# Altium schematic symbol library Schlib.SchLib: 725 symbols (part 5 of 6)
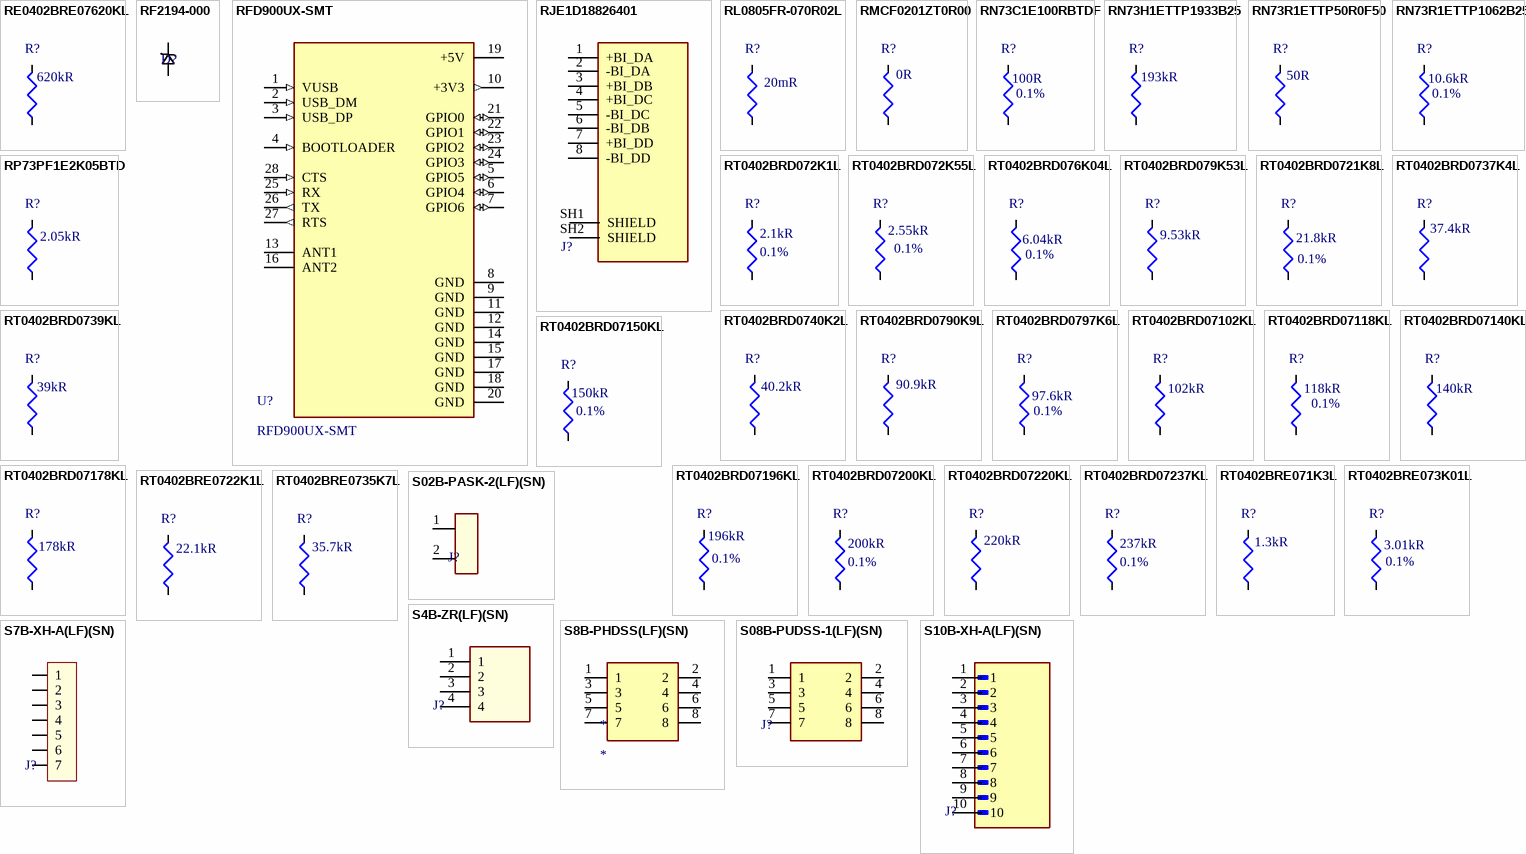
[diagram p25: symbols RE0402BRE07620KL to S10B-XH-A(LF)(SN)]

## RT0402BRD0790K9L
designator R?  value 90.9kR  (hidden comment: *)
Res Thin Film 0402 90.9K Ohm 0.1% 0.063W(1/16W) ±25ppm/C Pad SMD T/R; Manufacturer: Yageo; Manufacturer Part Number: RT0402BRD0790K9L; Voltage Rating (DC): 50V; Supplier: Digikey; Supplier Part Number: YAG1489CT-ND; RoHS: Yes; Category: Chip SMD Resistors; Stock: 8815; Pricing: 1=0.16, 10=0.121, 50=0.0958, 100=0.0859, 500=0.0654, 1000=0.0578, 5000=0.04283 (USD); Lead Free: 5697LeadFree; RoHS Compliant: 5897YesNo; ComponentLink1URL: https://datasheet.ciiva.com/2582/pyu-rt-1-to-0-05-rohs-l-4-2582525.pdf?src-supplier=Digikey; ComponentLink1Description: https://datasheet.ciiva.com/2582/pyu-rt-1-to-0-05-rohs-l-4-2582525.pdf?src-supplier=Digikey; ComponentLink2URL: https://datasheet.ciiva.com/46635/pyu-rt-1-to-0-05-rohs-l-5-46635097.pdf?src-supplier=Digikey; ComponentLink2Description: https://datasheet.ciiva.com/46635/pyu-rt-1-to-0-05-rohs-l-5-46635097.pdf?src-supplier=Digikey; Parameter 1: *; Case/Package: 0402
footprint R 0402 (1005 Metric) (Chip Capacitor, Body 1.0x0.5mm, IPC High Density)
pins: 1 B, 2 A

## RT0402BRD0797K6L
designator R?  value 97.6kR  Tolerance: 0.1%  (hidden comment: *)
Res Thin Film 0402 97.6K Ohm 0.1% 0.063W(1/16W) ±25ppm/C Pad SMD T/R; Manufacturer: Yageo; Manufacturer Part Number: RT0402BRD0797K6L; Voltage Rating (DC): 50V; Supplier: Arrow Electronics; Supplier Part Number: RT0402BRD0797K6L; RoHS: Yes; Category: Chip SMD Resistors; Stock: 301; Pricing: 1=0.0267, 10=0.0253, 25=0.024, 100=0.0227, 250=0.0214 (USD); Lead Free: 5697LeadFree; ComponentLink1URL: https://datasheet.ciiva.com/2582/pyu-rt-1-to-0-05-rohs-l-5-2582537.pdf?src-supplier=Digikey; ComponentLink1Description: https://datasheet.ciiva.com/2582/pyu-rt-1-to-0-05-rohs-l-5-2582537.pdf?src-supplier=Digikey; Parameter 1: *
footprint R 0402 (1005 Metric) (Chip Capacitor, Body 1.0x0.5mm, IPC High Density)
pins: 1 B, 2 A

## RT0402BRD07102KL
designator R?  value 102kR  (hidden comment: *)
Res Thin Film 0402 102K Ohm 0.1% 0.063W(1/16W) ±25ppm/C Pad SMD T/R; Manufacturer: Yageo; Manufacturer Part Number: RT0402BRD07102KL; Voltage Rating: 50V; Power Rating: 62.5mW; Max Power Dissipation: 63mW; Temperature Coefficient: 25ppm/°C; Supplier: Avnet; Supplier Part Number: RT0402BRD07102KL; RoHS: Yes; Category: Chip SMD Resistors; Stock: 10000; Pricing: 10000=0.02244 (USD); Case/Package: 0402; Case Code (Metric): 1005; Case Code (Imperial): 0402; Min Operating Temperature: -55°C; Max Operating Temperature: 155°C; Tolerance: 0.1%; Packaging: Tape and Reel; Number of Terminations: 2; Package Quantity: 10000; Termination: SMD/SMT; Voltage Rating (DC): 50V; Features: Moisture Resistant; Series: RT; Length: 0.039inch; Width: 0.02inch; Height: 0.014inch; Lead Free: Lead Free; RoHS Compliant: Yes; ComponentLink1URL: https://datasheet.ciiva.com/12724/pyu-rt-1-to-0-05-rohs-l-4-12724383.pdf?src-supplier=Mouser; ComponentLink1Description: https://datasheet.ciiva.com/12724/pyu-rt-1-to-0-05-rohs-l-4-12724383.pdf?src-supplier=Mouser
footprint R 0402 (1005 Metric) (Chip Capacitor, Body 1.0x0.5mm, IPC High Density)
pins: 1 B, 2 A

## RT0402BRD07118KL
designator R?  value 118kR  Tolerance: 0.1%  (hidden comment: *)
Thin Film Resistors - SMD 1/16W 118K ohm .1% 25ppm; Manufacturer: Yageo; Manufacturer Part Number: RT0402BRD07118KL; Voltage Rating: 50V; Power Rating: 62.5mW; Temperature Coefficient: 25ppm/°C; Max Power Dissipation: 63mW; Supplier: Digikey; Supplier Part Number: 13-RT0402BRD07118KLCT-ND; RoHS: Yes; Category: Chip SMD Resistors; Stock: 19401; Pricing: 1=0.2, 10=0.153, 50=0.1204, 100=0.1081, 500=0.0816, 1000=0.07242, 5000=0.05304 (USD); Case/Package: 0402; Case Code (Metric): 1005; Case Code (Imperial): 0402; Min Operating Temperature: -55°C; Max Operating Temperature: 155°C; Packaging: Tape and Reel; Termination: SMD/SMT; Number of Terminations: 2; Features: Moisture Resistant; Series: RT; Length: 0.039inch; Width: 0.02inch; Height: 0.014inch; RoHS Compliant: Yes; ComponentLink1URL: https://datasheet.ciiva.com/12722/pyu-rt-1-to-0-05-rohs-l-4-12722485.pdf?src-supplier=Mouser; ComponentLink1Description: https://datasheet.ciiva.com/12722/pyu-rt-1-to-0-05-rohs-l-4-12722485.pdf?src-supplier=Mouser
footprint R 0402 (1005 Metric) (Chip Capacitor, Body 1.0x0.5mm, IPC High Density)
pins: 1 B, 2 A

## RT0402BRD07140KL
designator R?  value 140kR  (hidden comment: *)
SMD Chip Resistor, 140 kOhm, ± 0.1%, 63 mW, 0402 [1005 Metric], Thin Film, High Precision High Stability; Manufacturer: Yageo; Manufacturer Part Number: RT0402BRD07140KL; Temperature Coefficient: 25ppm/°C; Supplier: Farnell; Supplier Part Number: 4312055; RoHS: Yes; Category: Chip SMD Resistors; Stock: 9900; Pricing: 10=0.121, 100=0.105, 500=0.066, 2500=0.057, 5000=0.048, 10000=0.047, 50000=0.0461, 100000=0.0451 (EUR); Case/Package: 0402; Packaging: 10Packaging; ComponentLink1URL: https://datasheet.octopart.com/RT0402BRD07140KL-Yageo-datasheet-166250672.pdf?src-supplier=Future+Electronics; ComponentLink1Description: https://datasheet.octopart.com/RT0402BRD07140KL-Yageo-datasheet-166250672.pdf?src-supplier=Future+Electronics; ComponentLink2URL: https://datasheet.octopart.com/RT0402BRD07140KL-Yageo-datasheet-164439670.pdf?src-supplier=Newark; ComponentLink2Description: https://datasheet.octopart.com/RT0402BRD07140KL-Yageo-datasheet-164439670.pdf?src-supplier=Newark
footprint R 0402 (1005 Metric) (Chip Capacitor, Body 1.0x0.5mm, IPC High Density)
pins: 1 B, 2 A

## RT0402BRD07150KL
designator R?  value 150kR  Tolerance: 0.1%  (hidden comment: *)
Fixed Resistor, Thin Film, 0.0625W, 150000ohm, 50V, 0.1% +/-Tol, 25ppm/Cel, Surface Mount, 0402; Manufacturer: Yageo; Manufacturer Part Number: RT0402BRD07150KL; Power Rating: 63mW; Temperature Coefficient: 25ppm/°C; Supplier: Avnet; Supplier Part Number: RT0402BRD07150KL; RoHS: Yes; Category: Chip SMD Resistors; Stock: 10000; Pricing: 10000=0.01953, 20000=0.01936, 40000=0.01903, 60000=0.0187, 80000=0.01837 (USD); Case/Package: 0402; Min Operating Temperature: -55°C; Max Operating Temperature: 155°C; Packaging: 10Packaging; Voltage Rating: 50V; Height: 350um; RoHS Compliant: Yes
footprint R 0402 (1005 Metric) (Chip Capacitor, Body 1.0x0.5mm, IPC High Density)
pins: 1 B, 2 A

## RT0402BRD07178KL
designator R?  value 178kR  (hidden comment: *)
SMD Chip Resistor, 178 kOhm, ± 0.1%, 63 mW, 0402 [1005 Metric], Thin Film, High Precision High Stability; Manufacturer: Yageo; Manufacturer Part Number: RT0402BRD07178KL; Max Power Dissipation: 63mW; Temperature Coefficient: 25ppm/°C; Voltage Rating: 50V; Supplier: Digikey; Supplier Part Number: 13-RT0402BRD07178KLCT-ND; RoHS: Yes; Category: Chip SMD Resistors; Stock: 8658; Pricing: 1=0.2, 10=0.153, 50=0.1204, 100=0.1081, 500=0.0816, 1000=0.07242, 5000=0.05304 (USD); Case/Package: 0402; Min Operating Temperature: -55°C; Max Operating Temperature: 155°C; Packaging: Tape and Reel; Number of Terminations: 2; Tolerance: 0.1%; Features: Moisture Resistant; Series: RT; Length: 0.039inch; Width: 0.02inch; Height: 0.014inch; ComponentLink1URL: http://www.yageo.com/documents/recent/PYu-RT_1-to-0.01_RoHS_L_8.pdf?src-supplier=Digikey; ComponentLink1Description: http://www.yageo.com/documents/recent/PYu-RT_1-to-0.01_RoHS_L_8.pdf?src-supplier=Digikey
footprint R 0402 (1005 Metric) (Chip Capacitor, Body 1.0x0.5mm, IPC High Density)
pins: 1 B, 2 A

## RT0402BRD07196KL
designator R?  value 196kR  Tolerance: 0.1%  (hidden comment: *)
High Precision-High Stability Chip Resistor Thin Film 0402 196kOhm 0.1% Paper T/R; Manufacturer: Yageo; Manufacturer Part Number: RT0402BRD07196KL; Supplier: Digikey; Supplier Part Number: 13-RT0402BRD07196KLCT-ND; RoHS: Yes; Category: Chip SMD Resistors; Stock: 9600; Pricing: 1=0.2, 10=0.15, 50=0.1174, 100=0.1051, 500=0.07972, 1000=0.07035, 5000=0.05199 (USD); RoHS Compliant: Yes; Case/Package: 0402
footprint R 0402 (1005 Metric) (Chip Capacitor, Body 1.0x0.5mm, IPC High Density)
pins: 1 B, 2 A

## RT0402BRD07200KL
designator R?  value 200kR  Tolerance: 0.1%  (hidden comment: *)
Fixed Resistor, Thin Film, 0.0625W, 200000ohm, 50V, 0.1% +/-Tol, 25ppm/Cel, Surface Mount, 0402; Manufacturer: Yageo; Manufacturer Part Number: RT0402BRD07200KL; Supplier: Rs; Supplier Part Number: 1991302P; RoHS: Yes; Category: Chip SMD Resistors; Stock: 15000; Pricing: 100=0.099, 250=0.082, 500=0.066, 1000=0.055 (EUR); Voltage Rating: 50V; ComponentLink1URL: https://datasheet.octopart.com/RT0402BRD07200KL-Yageo-datasheet-166250672.pdf?src-supplier=Future+Electronics; ComponentLink1Description: https://datasheet.octopart.com/RT0402BRD07200KL-Yageo-datasheet-166250672.pdf?src-supplier=Future+Electronics; ComponentLink2URL: http://www.yageo.com/documents/recent/PYu-RT_1-to-0.01_RoHS_L_9.pdf?src-supplier=Digikey; ComponentLink2Description: http://www.yageo.com/documents/recent/PYu-RT_1-to-0.01_RoHS_L_9.pdf?src-supplier=Digikey; ComponentLink3URL: https://datasheet.octopart.com/RT0402BRD07200KL-Yageo-datasheet-164439670.pdf?src-supplier=Newark; ComponentLink3Description: https://datasheet.octopart.com/RT0402BRD07200KL-Yageo-datasheet-164439670.pdf?src-supplier=Newark; Case/Package: 0402
footprint R 0402 (1005 Metric) (Chip Capacitor, Body 1.0x0.5mm, IPC High Density)
pins: 1 B, 2 A

## RT0402BRD07220KL
designator R?  value 220kR  (hidden comment: *)
High Precision-High Stability Chip Resistor Thin Film 0402 220kOhm 0.1% Paper T/R; Manufacturer: Yageo; Manufacturer Part Number: RT0402BRD07220KL; Supplier: Arrow Electronics; Supplier Part Number: RT0402BRD07220KL; RoHS: Yes; Category: Chip SMD Resistors; Stock: 310000; Pricing: 10000=0.047, 20000=0.0452, 30000=0.0442, 50000=0.0425, 100000=0.0416 (USD); Case/Package: 0402
footprint R 0402 (1005 Metric) (Chip Capacitor, Body 1.0x0.5mm, IPC High Density)
pins: 1 B, 2 A

## RT0402BRD07237KL
designator R?  value 237kR  Tolerance: 0.1%  (hidden comment: *)
Res Thin Film 0402 237K Ohm 0.1% 1/16W ±25ppm/°C Molded SMD Paper T/R; Manufacturer: Yageo; Manufacturer Part Number: RT0402BRD07237KL; Supplier: Digikey; Supplier Part Number: 13-RT0402BRD07237KLCT-ND; RoHS: Yes; Category: Chip SMD Resistors; Stock: 26932; Pricing: 1=0.13, 10=0.098, 50=0.0772, 100=0.0691, 500=0.05242, 1000=0.0466 (USD); Case/Package: 343Case; Packaging: 10Packaging; Temperature Coefficient: 25ppm/°C; RoHS Compliant: Yes
footprint R 0402 (1005 Metric) (Chip Capacitor, Body 1.0x0.5mm, IPC High Density)
pins: 1 B, 2 A

## RT0402BRE071K3L
designator R?  value 1.3kR  (hidden comment: *)
Res Thin Film 0402 1.3K Ohm 0.1% 1/16W ±50ppm/°C Molded SMD Paper T/R; Manufacturer: Yageo; Manufacturer Part Number: RT0402BRE071K3L; Supplier: Future Electronics; Supplier Part Number: 1029168; RoHS: Yes; Category: Chip SMD Resistors; Stock: 50000; Pricing: 10000=0.027, 20000=0.0266, 30000=0.0264, 40000=0.0262, 50000=0.0256 (USD); ComponentLink1URL: https://datasheet.ciiva.com/2582/pyu-rt-1-to-0-05-rohs-l-5-2582654.pdf?src-supplier=Digikey; ComponentLink1Description: https://datasheet.ciiva.com/2582/pyu-rt-1-to-0-05-rohs-l-5-2582654.pdf?src-supplier=Digikey; Case/Package: 0402
footprint R 0402 (1005 Metric) (Chip Capacitor, Body 1.0x0.5mm, IPC High Density)
pins: 1 B, 2 A

## RT0402BRE073K01L
designator R?  value 3.01kR  Tolerance: 0.1%  (hidden comment: *)
Res High precision Thin Film 0402 3.01K Ohm 0.1% 1/16W ±50ppm/°C Molded SMD Paper T/R; Manufacturer: Yageo; Manufacturer Part Number: RT0402BRE073K01L; Max Power Dissipation: 63mW; Voltage Rating (DC): 50V; Supplier: Digikey; Supplier Part Number: YAG4379CT-ND; RoHS: Yes; Category: Chip SMD Resistors; Stock: 2686; Pricing: 1=0.16, 10=0.123, 50=0.098, 100=0.0877, 500=0.06732, 1000=0.05916, 5000=0.04488 (USD); Case/Package: 0402; Case Code (Imperial): 0402; Min Operating Temperature: -55°C; Max Operating Temperature: 155°C; Package Quantity: 10000; Packaging: Tape and Reel; Number of Terminations: 2; Temperature Coefficient: 50ppm/°C; Series: RT; Length: 0.039inch; Width: 0.02inch; Height: 0.014inch; Lead Free: Lead Free; RoHS Compliant: Yes; ComponentLink1URL: https://datasheet.ciiva.com/2582/pyu-rt-1-to-0-05-rohs-l-5-2582801.pdf?src-supplier=Digikey; ComponentLink1Description: https://datasheet.ciiva.com/2582/pyu-rt-1-to-0-05-rohs-l-5-2582801.pdf?src-supplier=Digikey
footprint R 0402 (1005 Metric) (Chip Capacitor, Body 1.0x0.5mm, IPC High Density)
pins: 1 B, 2 A

## RT0402BRE0722K1L
designator R?  value 22.1kR  (hidden comment: *)
High Precision-High Stability Chip Resistor Thin Film 0402 22.1kOhm 0.1% Paper T/R; Manufacturer: Yageo; Manufacturer Part Number: RT0402BRE0722K1L; Max Power Dissipation: 63mW; Temperature Coefficient: 50ppm/°C; Voltage Rating (DC): 50V; Supplier: Arrow Electronics; Supplier Part Number: RT0402BRE0722K1L; RoHS: Yes; Category: Chip SMD Resistors; Stock: 9703; Pricing: 1=0.0648, 10=0.0427, 25=0.0361, 100=0.033, 250=0.0327, 500=0.0303, 1000=0.0294, 3000=0.0285, 6000=0.0276 (USD); Case/Package: 0402; Case Code (Imperial): 0402; Min Operating Temperature: -55°C; Max Operating Temperature: 155°C; Package Quantity: 10000; Packaging: Tape and Reel; Tolerance: 0.1%; Number of Terminations: 2; Series: RT; Length: 0.039inch; Width: 0.02inch; Height: 0.014inch; Lead Free: Lead Free; RoHS Compliant: Yes; ComponentLink1URL: https://datasheet.ciiva.com/2582/pyu-rt-1-to-0-05-rohs-l-5-2582688.pdf?src-supplier=Digikey; ComponentLink1Description: https://datasheet.ciiva.com/2582/pyu-rt-1-to-0-05-rohs-l-5-2582688.pdf?src-supplier=Digikey
footprint R 0402 (1005 Metric) (Chip Capacitor, Body 1.0x0.5mm, IPC High Density)
pins: 1 B, 2 A

## RT0402BRE0735K7L
designator R?  value 35.7kR  (hidden comment: *)
High Precision-High Stability Chip Resistor Thin Film 0402 35.7kOhm 0.1% Paper T/R; Manufacturer: Yageo; Manufacturer Part Number: RT0402BRE0735K7L; Max Power Dissipation: 63mW; Temperature Coefficient: 50ppm/°C; Voltage Rating (DC): 50V; Supplier: Digikey; Supplier Part Number: 13-RT0402BRE0735K7LCT-ND; RoHS: Yes; Category: Chip SMD Resistors; Stock: 9540; Pricing: 1=0.16, 10=0.123, 50=0.098, 100=0.0877, 500=0.06732, 1000=0.05916, 5000=0.04488 (USD); Case/Package: 0402; Min Operating Temperature: -55°C; Max Operating Temperature: 155°C; Packaging: Tape and Reel; Tolerance: 0.1%; Number of Terminations: 2; Series: RT; Lead Free: Lead Free; RoHS Compliant: Yes; ComponentLink1URL: https://datasheet.ciiva.com/2582/pyu-rt-1-to-0-05-rohs-l-5-2582781.pdf?src-supplier=Digikey; ComponentLink1Description: https://datasheet.ciiva.com/2582/pyu-rt-1-to-0-05-rohs-l-5-2582781.pdf?src-supplier=Digikey
footprint R 0402 (1005 Metric) (Chip Capacitor, Body 1.0x0.5mm, IPC High Density)
pins: 1 B, 2 A

## S02B-PASK-2(LF)(SN)
designator J?  (value not drawn)
PA Series 2 Position 2.0mm Through Hole Wire to Board Single Row Shrouded Header; Manufacturer: JST; Manufacturer Part Number: S02B-PASK-2(LF)(SN); Supplier: Digi-Key; Supplier Part Number: 455-1847-ND; RoHS: Yes; Category: Headers and Wire Housings; Stock: 10952; Pricing: 1=0.32000, 10=0.27600, 100=0.21480, 500=0.18414, 1000=0.15345, 5000=0.13153, 10000=0.12276 (USD); ComponentLink1URL: https://datasheet.ciiva.com/16287/jst20s02b-pask-2-lf-sn-16287033.pdf?src-supplier=Future+Electronics; ComponentLink1Description: https://datasheet.ciiva.com/16287/jst20s02b-pask-2-lf-sn-16287033.pdf?src-supplier=Future+Electronics; ComponentLink2URL: https://datasheet.ciiva.com/11750/0900766b805adc75-11750278.pdf?src-supplier=Rs; ComponentLink2Description: https://datasheet.ciiva.com/11750/0900766b805adc75-11750278.pdf?src-supplier=Rs; ComponentLink3URL: https://datasheet.ciiva.com/712/epa-f-712542.pdf?src-supplier=Digi-Key; ComponentLink3Description: https://datasheet.ciiva.com/712/epa-f-712542.pdf?src-supplier=Digi-Key; ComponentLink4URL: https://datasheet.ciiva.com/26938/getdatasheetpartid-651370-26938326.pdf?src-supplier=Verical; ComponentLink4Description: https://datasheet.ciiva.com/26938/getdatasheetpartid-651370-26938326.pdf?src-supplier=Verical
footprint S02B-PASK-2
pins: 1 (power), 2

## S4B-ZR(LF)(SN)
designator J?  (value not drawn)
Header for PCB; pitch 1.50mm; 4-contacts; THT; male; side entry; 50V/1A; Manufacturer: JST; Manufacturer Part Number: S4B-ZR(LF)(SN); Body Plating: Tin; Number of Positions: 4; Voltage Rating: 50V; Current Rating: 1A; Contact Resistance: 30mR; Insulation Resistance: 500MR; Pitch: 1.5mm; Panel Thickness: 3.5mm; Supplier: Future Electronics; Supplier Part Number: 5947445; RoHS: Yes; Category: Headers and Wire Housings; Stock: 21023; Pricing: 1=0.102, 250=0.0998, 1000=0.0963, 2500=0.094, 10000=0.0886 (USD); Mounting Technology: Through Hole; Pins: 4; Contact Material: Brass,Tin,Copper; Contact Plating: Tin,Copper; Color: White; Housing Color: Beige; Housing Material: Polyamide; Contact Shape: Circular; Insulation Material: Nylon; Insulation Color: Natural; Contact Finish - Mating: TIN; Material: Nylon; Min Operating Temperature: -25°C; Max Operating Temperature: 85°C; Number of Rows: 1; Packaging: Bulk; Termination: Solder; Gender: Male; Number of Contacts: 4; Series: ZH; Fastening Type: Detent; Orientation: Right Angle; Contact Type: Male Pin; Connector Type: Header; Max Current Rating: 1A; Max Voltage Rating (AC): 50V; Voltage Rating (AC): 50V; Voltage Rating (DC): 50V; Max Voltage Rating (DC): 50V; Length: 7.5mm; Width: 3.5mm; Height: 7.2mm; Depth: 6mm; Lead Pitch: 1.5mm; Lead Free: Lead Free; Reach SVHC Compliant: No; Flammability Rating: UL94 V-0; ComponentLink1URL: https://datasheet.ciiva.com/11752/0900766b8082f593-11752195.pdf?src-supplier=Rs; ComponentLink1Description: https://datasheet.ciiva.com/11752/0900766b8082f593-11752195.pdf?src-supplier=Rs; ComponentLink2URL: https://datasheet.ciiva.com/25616/0900766b81147f94-25616835.pdf?src-supplier=Rs; ComponentLink2Description: https://datasheet.ciiva.com/25616/0900766b81147f94-25616835.pdf?src-supplier=Rs; ComponentLink3URL: https://datasheet.ciiva.com/26894/getdatasheetpartid-640380-26894625.pdf?src-supplier=Verical; ComponentLink3Description: https://datasheet.ciiva.com/26894/getdatasheetpartid-640380-26894625.pdf?src-supplier=Verical; ComponentLink4URL: https://datasheet.ciiva.com/16225/s4b-zrlfsn-16225107.pdf?src-supplier=Future+Electronics; ComponentLink4Description: https://datasheet.ciiva.com/16225/s4b-zrlfsn-16225107.pdf?src-supplier=Future+Electronics; ComponentLink5URL: https://datasheet.ciiva.com/26894/getdatasheetpartid-703398-26894926.pdf?src-supplier=Verical; ComponentLink5Description: https://datasheet.ciiva.com/26894/getdatasheetpartid-703398-26894926.pdf?src-supplier=Verical; ComponentLink6URL: https://datasheet.ciiva.com/26924/getdatasheetpartid-763273-26924080.pdf?src-supplier=Verical; ComponentLink6Description: https://datasheet.ciiva.com/26924/getdatasheetpartid-763273-26924080.pdf?src-supplier=Verical; ComponentLink7URL: https://datasheet.ciiva.com/712/ezh-712489.pdf?src-supplier=Digikey; ComponentLink7Description: https://datasheet.ciiva.com/712/ezh-712489.pdf?src-supplier=Digikey; ComponentLink8URL: https://datasheet.ciiva.com/8052/80556-8052237.pdf?src-supplier=Element14; ComponentLink8Description: https://datasheet.ciiva.com/8052/80556-8052237.pdf?src-supplier=Element14
footprint S4B-ZR
pins: 1, 2, 3, 4

## S7B-XH-A(LF)(SN)
designator J?  (value not drawn)
Conn Shrouded Header (4 Sides) HDR 7 POS 2.5mm Solder RA Side Entry Thru-Hole Box; Manufacturer: JST; Manufacturer Part Number: S7B-XH-A(LF)(SN); Current Rating: 3A; Number of Positions: 7; Voltage Rating: 250V; Gender: Male; Supplier: Arrow Electronics; Supplier Part Number: S7B-XH-A(LF)(SN); RoHS: Yes; Category: Headers and Wire Housings; Stock: 7767; Pricing: 1=0.418, 10=0.3357, 25=0.3321, 50=0.3287, 100=0.2604, 500=0.1694 (USD); Mounting Technology: Through Hole; Contact Material: Brass; Contact Plating: Tin; Contact Shape: Square; Insulation Material: Nylon; Insulation Color: Natural; Contact Finish - Mating: TIN; Weight: 28.349523g; Min Operating Temperature: -25°C; Max Operating Temperature: 85°C; Number of Rows: 1; Packaging: Bulk; Termination: Solder; Orientation: Right Angle; Series: XH; Contact Type: Male Pin; Number of Contacts: 7; Connector Type: Header; Fastening Type: Detent; Pitch: 2.5mm; Reach SVHC Compliant: No; Lead Free: Lead Free; Flammability Rating: UL94 V-0; ComponentLink1URL: https://datasheet.ciiva.com/8052/5448-8052233.pdf?src-supplier=Element14; ComponentLink1Description: https://datasheet.ciiva.com/8052/5448-8052233.pdf?src-supplier=Element14; ComponentLink2URL: https://datasheet.ciiva.com/726/exh-726397.pdf?src-supplier=Digikey; ComponentLink2Description: https://datasheet.ciiva.com/726/exh-726397.pdf?src-supplier=Digikey; ComponentLink3URL: https://datasheet.ciiva.com/16484/exh-16484539.pdf?src-supplier=Future+Electronics; ComponentLink3Description: https://datasheet.ciiva.com/16484/exh-16484539.pdf?src-supplier=Future+Electronics
footprint S7B-XH-A(LF)(SN)
pins: 1, 2, 3, 4, 5, 6, 7

## S8B-PHDSS(LF)(SN)
designator *
JST, Connector Header, 8 Position, Right Angle, 2.00mm, Shrouded - 4 Wall, Through Hole, Solder, Detent Lock, Natural; Manufacturer Part Number: S8B-PHDSS(LF)(SN); Supplier: Future Electronics; Supplier Part Number: 1796663; Manufacturer: JST; RoHS: Yes; Category: Headers and Wire Housings; Stock: 500; Pricing: 500=0.235, 1500=0.225, 2500=0.225, 5000=0.22, 10000=0.21 (USD); ComponentLink1URL: https://datasheet.ciiva.com/16484/ephd-16484632.pdf?src-supplier=Future+Electronics; ComponentLink1Description: https://datasheet.ciiva.com/16484/ephd-16484632.pdf?src-supplier=Future+Electronics
footprint S8B-PHDSS
pins: 1, 2, 3, 4, 5, 6, 7, 8

## S08B-PUDSS-1(LF)(SN)
designator J?  (value not drawn)
PUD RoHS Compliant 2009 GENERAL PURPOSE Connector Header -25C~85C 3A 250V 0.118 3.00mm; Manufacturer: JST; Manufacturer Part Number: S08B-PUDSS-1(LF)(SN); Number of Positions: 8; Gender: 29Gender; Supplier: CoreStaff; Supplier Part Number: ST50659435; RoHS: Yes; Category: Headers and Wire Housings; Stock: 105; Pricing: 1=43.385, 10=36.379, 50=32.179, 100=28.663, 500=28.627, 1000=28.553, 2000=28.408, 4000=28.264 (JPY); Mounting Technology: Through Hole; Contact Material: Copper Alloy,Copper; Contact Plating: Tin; Contact Shape: Square; Contact Finish - Mating: TIN; Insulation Material: Nylon; Insulation Color: Natural; Min Operating Temperature: -25°C; Max Operating Temperature: 85°C; Number of Rows: 2; Fastening Type: Latch; Packaging: Bulk; Termination: Solder; Number of Contacts: 8; Connector Type: Header; Series: PUD; Contact Type: Male Pin; Voltage Rating: 250V; Current Rating: 3A; Height: 8.5mm; Lead Free: Lead Free; Flammability Rating: UL94 V-0; Reach SVHC Compliant: Unknown; ComponentLink1URL: https://datasheet.ciiva.com/730/sxxb-pudxs-1lfsn-730745.pdf?src-supplier=Digikey; ComponentLink1Description: https://datasheet.ciiva.com/730/sxxb-pudxs-1lfsn-730745.pdf?src-supplier=Digikey
footprint S08B-PUDSS-1
pins: 1, 2, 3, 4, 5, 6, 7, 8

## S10B-XH-A(LF)(SN)
designator J?  (value not drawn)
Conn Shrouded Header (4 Sides) HDR 10 POS 2.5mm Solder RA Side Entry Thru-Hole Box; Manufacturer: JST; Manufacturer Part Number: S10B-XH-A(LF)(SN); Connector Type: Male Pin; Contact Resistance: 20mΩ; Current Rating: 3A; Gender: Male; Insulation Resistance: 1GΩ; Number of Contacts: 10; Pitch: 2.4892mm; Voltage Rating: 250V; Wire/Cable Gauge: 22AWG; Supplier: RS; Supplier Part Number: 8201573; RoHS: Compliant; Category: Headers and Wire Housings; Stock: 65; Pricing: 5=0.478, 125=0.35, 500=0.328, 1250=0.31, 2500=0.29 (GBP); Color: Natural; Contact Gender: Male; Contact Material: Brass; Contact Plating: Tin; Height: 6.1mm; Lead Free: Lead Free; Lead Pitch: 2.5mm; Length: 25.4mm; Lifecycle Status: Production; Max Operating Temperature: 85°C; Min Operating Temperature: -25°C; Mounting Technology: Through Hole; Pins: 10; Number of Positions: 10; Number of Rows: 1; Orientation: Right Angle; REACH SVHC: No; Terminal Pitch: 2.5mm; Termination: Press-Fit; Voltage Rating (AC): 250V; Weight: 28.349523g; Width: 12.7mm; ComponentLink1URL: https://datasheet.octopart.com:443/S10B-XH-A%28LF%29%28SN%29-JST-datasheet-140264791.pdf?src-supplier=Upverter; ComponentLink1Description: https://datasheet.octopart.com:443/S10B-XH-A%28LF%29%28SN%29-JST-datasheet-140264791.pdf?src-supplier=Upverter; ComponentLink2URL: https://datasheet.octopart.com:443/S10B-XH-A%28LF%29%28SN%29-JST-datasheet-138896056.pdf?src-supplier=IHS; ComponentLink2Description: https://datasheet.octopart.com:443/S10B-XH-A%28LF%29%28SN%29-JST-datasheet-138896056.pdf?src-supplier=IHS; ComponentLink3URL: https://datasheet.octopart.com:443/S10B-XH-A%28LF%29%28SN%29-JST-datasheet-63094.pdf?src-supplier=element14+APAC; ComponentLink3Description: https://datasheet.octopart.com:443/S10B-XH-A%28LF%29%28SN%29-JST-datasheet-63094.pdf?src-supplier=element14+APAC; ComponentLink4URL: https://datasheet.octopart.com:443/S10B-XH-A-%28LF%29%28SN%29-JST-datasheet-62336360.pdf?src-supplier=element14+APAC; ComponentLink4Description: https://datasheet.octopart.com:443/S10B-XH-A-%28LF%29%28SN%29-JST-datasheet-62336360.pdf?src-supplier=element14+APAC; ComponentLink5URL: https://datasheet.octopart.com:443/S10B-XH-A%28LF%29%28SN%29-JST-datasheet-12510042.pdf?src-supplier=Future+Electronics; ComponentLink5Description: https://datasheet.octopart.com:443/S10B-XH-A%28LF%29%28SN%29-JST-datasheet-12510042.pdf?src-supplier=Future+Electronics; ComponentLink6URL: https://datasheet.octopart.com:443/S10B-XH-A%28LF%29%28SN%29-JST-datasheet-8325564.pdf?src-supplier=Future+Electronics; ComponentLink6Description: https://datasheet.octopart.com:443/S10B-XH-A%28LF%29%28SN%29-JST-datasheet-8325564.pdf?src-supplier=Future+Electronics
footprint S10B-XH-A(LF)(SN)
pins: 1, 2, 3, 4, 5, 6, 7, 8, 9, 10

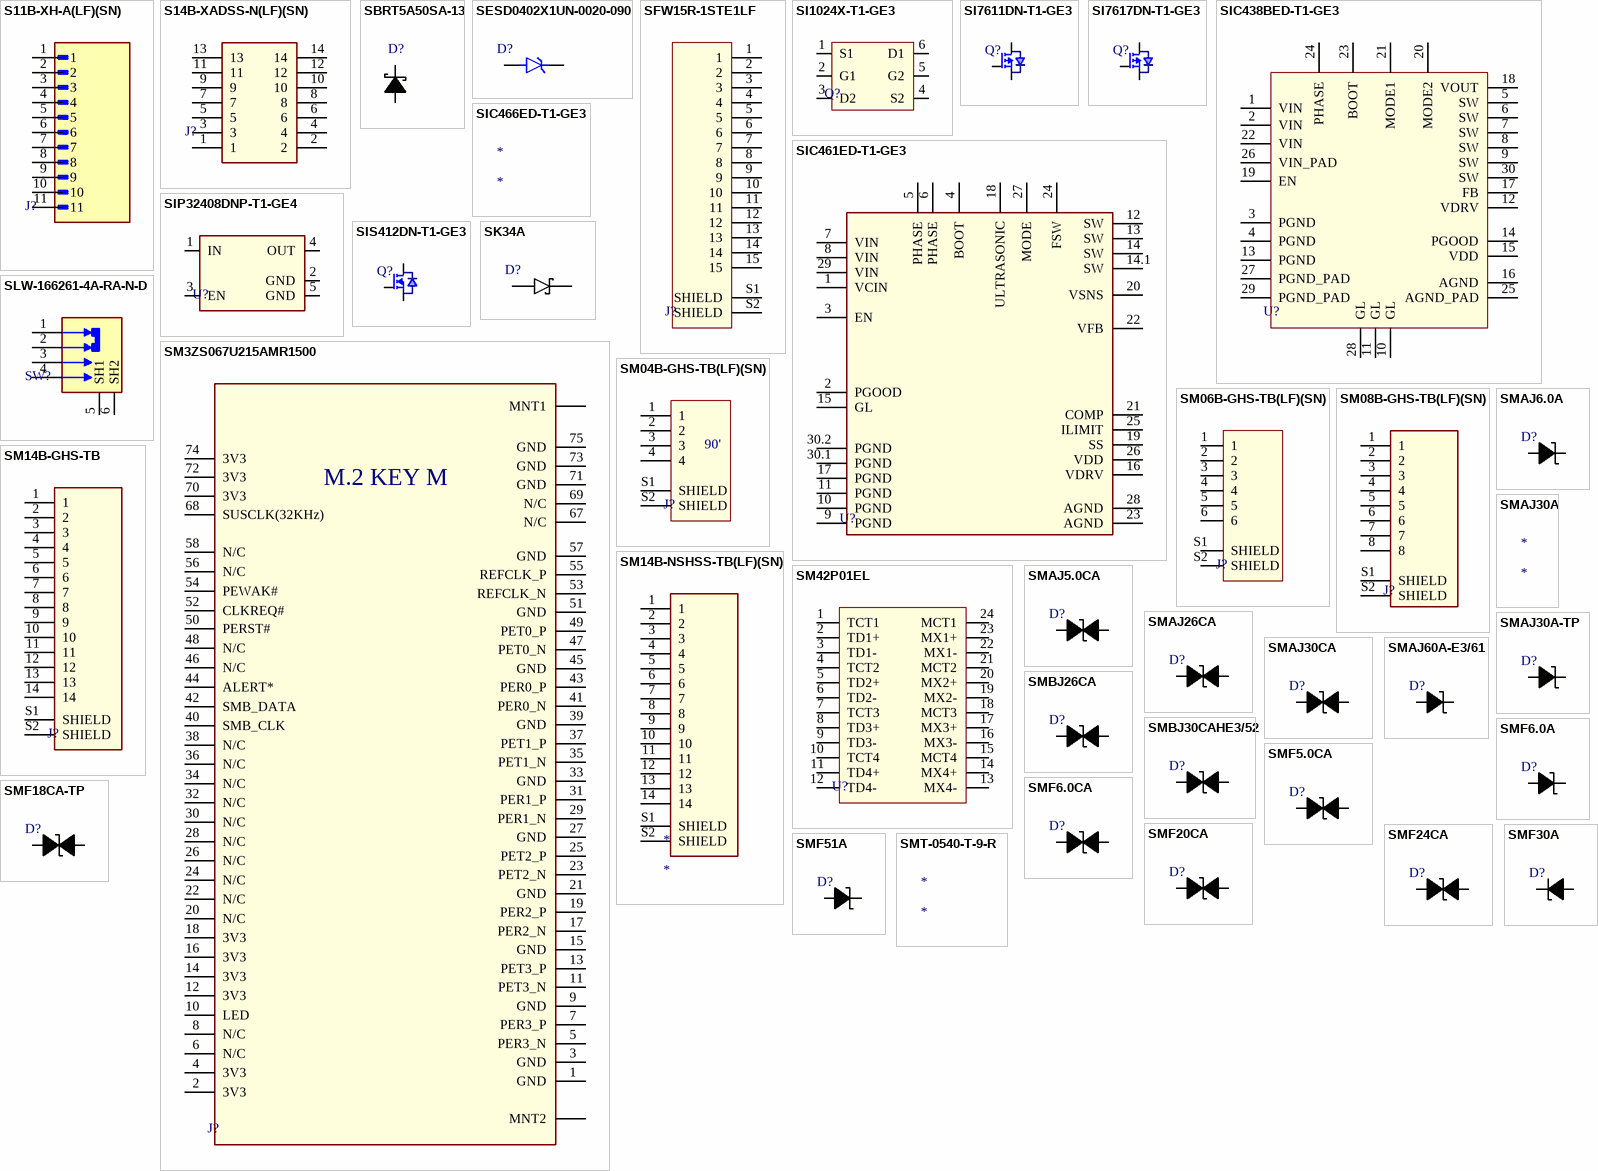
[diagram p17: symbols S11B-XH-A(LF)(SN) to SMT-0540-T-9-R]

## S11B-XH-A(LF)(SN)
designator J?
Conn Shrouded Header HDR 11 POS 2.5mm Solder RA Thru-Hole Box; Manufacturer: JST; Manufacturer Part Number: S11B-XH-A(LF)(SN); Connector Type: Male Pin; Contact Resistance: 20mΩ; Current Rating: 3A; Gender: Male; Insulation Resistance: 1GΩ; Number of Contacts: 11; Pitch: 2.4892mm; Voltage Rating: 250V; Wire/Cable Gauge: 22AWG; Supplier: RS; Supplier Part Number: 1755566; RoHS: Compliant; Category: Headers and Wire Housings; Stock: 20; Pricing: 10=0.39, 50=0.362, 100=0.338, 250=0.316, 500=0.297 (GBP); Color: Natural; Contact Gender: Male; Contact Material: Brass; Contact Plating: Tin; Export Control Classification Number (ECCN) Code: EAR99; Height: 6.1mm; Harmonized Tariff Schedule (HTS) Code: 8536.69.40.40; Introduction Date: 2010-11-30; Lead Pitch: 2.5mm; Lifecycle Status: Production; Max Operating Temperature: 85°C; Min Operating Temperature: -25°C; Mounting Technology: Through Hole; Pins: 11; Number of Positions: 11; Number of Rows: 1; Packaging: Bulk; REACH SVHC: No; Terminal Pitch: 2.5mm; Termination: Press-Fit; Voltage Rating (AC): 250V; ComponentLink1URL: https://datasheet.octopart.com:443/S11B-XH-A%28LF%29%28SN%29-JST-datasheet-140264791.pdf?src-supplier=Upverter; ComponentLink1Description: https://datasheet.octopart.com:443/S11B-XH-A%28LF%29%28SN%29-JST-datasheet-140264791.pdf?src-supplier=Upverter; ComponentLink2URL: https://datasheet.octopart.com:443/S11B-XH-A%28LF%29%28SN%29-JST-datasheet-138896056.pdf?src-supplier=IHS; ComponentLink2Description: https://datasheet.octopart.com:443/S11B-XH-A%28LF%29%28SN%29-JST-datasheet-138896056.pdf?src-supplier=IHS; ComponentLink3URL: https://datasheet.octopart.com:443/S11B-XH-A-%28LF%29%28SN%29-JST-datasheet-63094.pdf?src-supplier=element14+APAC; ComponentLink3Description: https://datasheet.octopart.com:443/S11B-XH-A-%28LF%29%28SN%29-JST-datasheet-63094.pdf?src-supplier=element14+APAC; ComponentLink4URL: https://datasheet.octopart.com:443/S11B-XH-A%28LF%29%28SN%29-JST-datasheet-178841412.pdf?src-supplier=Future+Electronics; ComponentLink4Description: https://datasheet.octopart.com:443/S11B-XH-A%28LF%29%28SN%29-JST-datasheet-178841412.pdf?src-supplier=Future+Electronics
footprint JST_S11B-XH-A(LF)(SN)
pins: 1, 2, 3, 4, 5, 6, 7, 8, 9, 10, 11
